# Altium footprint library My Footprint 3D.PCBLIB: 447 footprints (part 8 of 29)
Each footprint in its own frame and in the unit in brackets; x right, y up, seen from the top. Pads: shape width x height; smd on the part's side, far side on the other; paste and mask are expansions set on the pad; w line width, h text height; cw(c..) or ccw(c..) is an arc to the next point about the centre after c.
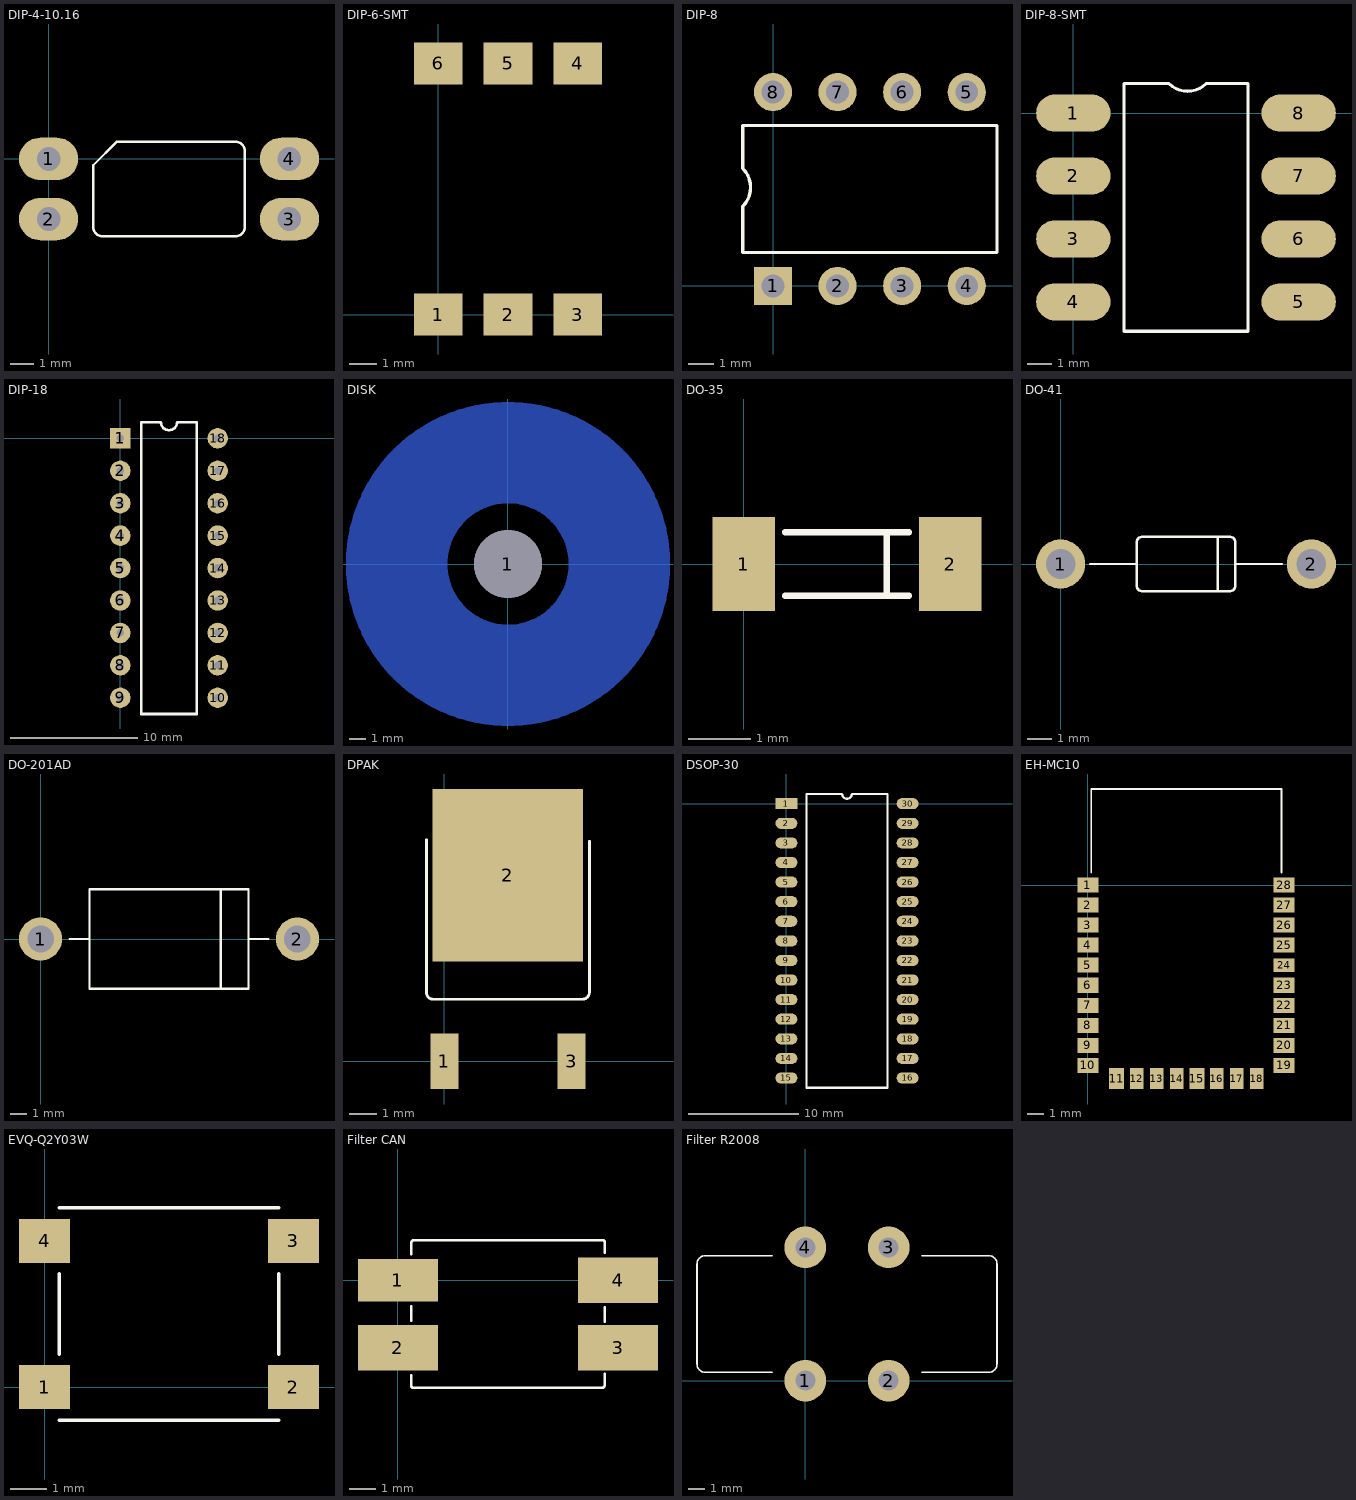
[diagram p7: the footprints below, top view; thin cyan lines are the x and y axes]

## DIP-4-10.16 [mm]
pads (4):
  oval 2.5x1.8 hole 1: 1(0,0) 2(0,-2.54) 3(10.16,-2.54) 4(10.16,0)
Top Overlay:
  lines w0.1: 1.88,-2.87 ccw(c2.28,-2.87) 2.28,-3.27 7.88,-3.27 ccw(c7.88,-2.87) 8.28,-2.87 8.28,0.33 ccw(c7.88,0.33) 7.88,0.73 2.88,0.73 1.88,-0.27 1.88,-2.87
3D body: height 4.01, standoff 4, extent 2.583,-0.369 3.38,0.429
3D body: height 2.4, standoff 2.1, extent 0.15,-3.14 2.05,-1.94
3D body: height 2.4, standoff 0.3, extent -0.15,-3.14 0.15,-1.94
3D body: height 1, standoff -2, extent -0.15,-2.79 0.15,-2.29
3D body: height 2.4, standoff 2.1, extent 0.15,-0.6 2.05,0.6
3D body: height 2.4, standoff 0.3, extent -0.15,-0.6 0.15,0.6
3D body: height 1, standoff -2, extent -0.15,-0.25 0.15,0.25
3D body: height 2.4, standoff 2.1, extent 8.11,-3.14 10.01,-1.94
3D body: height 2.4, standoff 0.3, extent 10.01,-3.14 10.31,-1.94
3D body: height 1, standoff -2, extent 10.01,-2.79 10.31,-2.29
3D body: height 1, standoff -2, extent 10.01,-0.25 10.31,0.25
3D body: height 2.4, standoff 0.3, extent 10.01,-0.6 10.31,0.6
3D body: height 2.4, standoff 2.1, extent 8.11,-0.6 10.01,0.6
3D body: height 4, standoff 0.5, extent 2.18,-3.774 8.584,1.23
3D body: height 3.5, standoff 0.5, extent 1.58,-3.77 8.58,1.23

## DIP-6-SMT [mm]
pads (6):
  rect 1.78x1.52 smd: 1(0,0) 2(2.54,0) 3(5.08,0) 4(5.08,9.144) 5(2.54,9.144) 6(0,9.144)
3D body: height 5, standoff 1.5, extent -1.71,1.422 6.79,7.722
3D body: height 3, standoff 2.8, extent -0.5,0.65 0.5,1.5
3D body: height 3, standoff 0.5, extent -0.5,0.45 0.5,0.65
3D body: height 0.5, standoff 0, extent -0.3,0.45 0.3,0.65
3D body: height 0.2, standoff 0, extent -0.3,-0.2 0.3,0.45
3D body: height 5.01, standoff 5, extent -0.595,2.001 0.6,3.199
3D body: height 3, standoff 2.8, extent 2.04,0.65 3.04,1.5
3D body: height 3, standoff 0.5, extent 2.04,0.45 3.04,0.65
3D body: height 0.5, standoff 0, extent 2.24,0.45 2.84,0.65
3D body: height 0.2, standoff 0, extent 2.24,-0.2 2.84,0.45
3D body: height 3, standoff 2.8, extent 4.58,0.65 5.58,1.5
3D body: height 3, standoff 0.5, extent 4.58,0.45 5.58,0.65
3D body: height 0.5, standoff 0, extent 4.78,0.45 5.38,0.65
3D body: height 0.2, standoff 0, extent 4.78,-0.2 5.38,0.45
3D body: height 3, standoff 2.8, extent 2.04,7.644 3.04,8.494
3D body: height 3, standoff 0.5, extent 2.04,8.494 3.04,8.694
3D body: height 0.5, standoff 0, extent 2.24,8.494 2.84,8.694
3D body: height 0.2, standoff 0, extent 2.24,8.694 2.84,9.344
3D body: height 3, standoff 2.8, extent -0.5,7.644 0.5,8.494
3D body: height 3, standoff 0.5, extent -0.5,8.494 0.5,8.694
3D body: height 0.5, standoff 0, extent -0.3,8.494 0.3,8.694
3D body: height 0.2, standoff 0, extent -0.3,8.694 0.3,9.344
3D body: height 3, standoff 2.8, extent 4.58,7.644 5.58,8.494
3D body: height 3, standoff 0.5, extent 4.58,8.494 5.58,8.694
3D body: height 0.5, standoff 0, extent 4.78,8.494 5.38,8.694
3D body: height 0.2, standoff 0, extent 4.78,8.694 5.38,9.344

## DIP-8 [mm]
pads (8):
  rect 1.5x1.5 hole 0.9: 1(0,0)
  round 1.5 hole 0.9: 2(2.54,0) 3(5.08,0) 4(7.62,0) 5(7.62,7.62) 6(5.08,7.62) 7(2.54,7.62) 8(0,7.62)
Top Overlay:
  lines w0.127: -1.19,1.31 8.81,1.31 8.81,6.31 -1.19,6.31 -1.19,4.619 cw(c-1.936,3.873) -1.19,3.128 -1.19,1.31
3D body: height 2.2, standoff 2, extent 7.12,6.86 8.12,7.71
3D body: height 2.2, standoff 0.2, extent 7.12,7.71 8.12,7.91
3D body: height 0.5, standoff -2, extent 7.32,7.71 7.92,7.91
3D body: height 2.2, standoff 2, extent 4.58,6.86 5.58,7.71
3D body: height 2.2, standoff 0.2, extent 4.58,7.71 5.58,7.91
3D body: height 0.5, standoff -2, extent 4.78,7.71 5.38,7.91
3D body: height 2.2, standoff 2, extent 2.04,6.86 3.04,7.71
3D body: height 2.2, standoff 0.2, extent 2.04,7.71 3.04,7.91
3D body: height 0.5, standoff -2, extent 2.24,7.71 2.84,7.91
3D body: height 2.2, standoff 2, extent -0.5,6.86 0.5,7.71
3D body: height 2.2, standoff 0.2, extent -0.5,7.71 0.5,7.91
3D body: height 0.5, standoff -2, extent -0.3,7.71 0.3,7.91
3D body: height 2.2, standoff 2, extent 7.12,-0.09 8.12,0.76
3D body: height 2.2, standoff 0.2, extent 7.12,-0.29 8.12,-0.09
3D body: height 0.5, standoff -2, extent 7.32,-0.29 7.92,-0.09
3D body: height 2.2, standoff 2, extent 4.58,-0.09 5.58,0.76
3D body: height 2.2, standoff 0.2, extent 4.58,-0.29 5.58,-0.09
3D body: height 0.5, standoff -2, extent 4.78,-0.29 5.38,-0.09
3D body: height 2.2, standoff 2, extent 2.04,-0.09 3.04,0.76
3D body: height 2.2, standoff 0.2, extent 2.04,-0.29 3.04,-0.09
3D body: height 0.5, standoff -2, extent 2.24,-0.29 2.84,-0.09
3D body: height 3.81, standoff 3.8, extent -0.595,1.261 0.6,2.459
3D body: height 0.5, standoff -2, extent -0.3,-0.29 0.3,-0.09
3D body: height 2.2, standoff 0.2, extent -0.5,-0.29 0.5,-0.09
3D body: height 2.2, standoff 2, extent -0.5,-0.09 0.5,0.76
3D body: height 3.8, standoff 0.5, extent -1.71,0.679 9.333,6.985

## DIP-8-SMT [mm]
height 8
pads (8):
  oval 3x1.5 smd: 1(0,0) 2(0,-2.54) 3(0,-5.08) 4(0,-7.62) 5(9.1,-7.62) 6(9.1,-5.08) 7(9.1,-2.54) 8(9.1,0)
Top Overlay:
  lines w0.127: 2.05,-8.81 7.05,-8.81 7.05,1.19 5.359,1.19 cw(c4.613,1.936) 3.868,1.19 2.05,1.19 2.05,-8.81
3D body: height 4, standoff 0.5, extent 1.419,-9.333 7.725,1.71
3D body: height 2.2, standoff 2, extent 0.65,-0.5 1.5,0.5
3D body: height 2.2, standoff 0.5, extent 0.45,-0.5 0.65,0.5
3D body: height 0.5, standoff 0, extent 0.45,-0.3 0.65,0.3
3D body: height 0.2, standoff 0, extent -0.2,-0.3 0.45,0.3
3D body: height 4.01, standoff 4, extent 2.001,-0.6 3.199,0.595
3D body: height 0.2, standoff 0, extent -0.2,-2.84 0.45,-2.24
3D body: height 0.5, standoff 0, extent 0.45,-2.84 0.65,-2.24
3D body: height 2.2, standoff 0.5, extent 0.45,-3.04 0.65,-2.04
3D body: height 2.2, standoff 2, extent 0.65,-3.04 1.5,-2.04
3D body: height 0.2, standoff 0, extent -0.2,-5.38 0.45,-4.78
3D body: height 0.5, standoff 0, extent 0.45,-5.38 0.65,-4.78
3D body: height 2.2, standoff 0.5, extent 0.45,-5.58 0.65,-4.58
3D body: height 2.2, standoff 2, extent 0.65,-5.58 1.5,-4.58
3D body: height 0.2, standoff 0, extent -0.2,-7.92 0.45,-7.32
3D body: height 0.5, standoff 0, extent 0.45,-7.92 0.65,-7.32
3D body: height 2.2, standoff 0.5, extent 0.45,-8.12 0.65,-7.12
3D body: height 2.2, standoff 2, extent 0.65,-8.12 1.5,-7.12
3D body: height 0.2, standoff 0, extent 8.65,-7.92 9.3,-7.32
3D body: height 0.5, standoff 0, extent 8.45,-7.92 8.65,-7.32
3D body: height 2.2, standoff 0.5, extent 8.45,-8.12 8.65,-7.12
3D body: height 2.2, standoff 2, extent 7.6,-8.12 8.45,-7.12
3D body: height 0.2, standoff 0, extent 8.65,-5.38 9.3,-4.78
3D body: height 0.5, standoff 0, extent 8.45,-5.38 8.65,-4.78
3D body: height 2.2, standoff 0.5, extent 8.45,-5.58 8.65,-4.58
3D body: height 2.2, standoff 2, extent 7.6,-5.58 8.45,-4.58
3D body: height 0.2, standoff 0, extent 8.65,-2.84 9.3,-2.24
3D body: height 0.5, standoff 0, extent 8.45,-2.84 8.65,-2.24
3D body: height 2.2, standoff 0.5, extent 8.45,-3.04 8.65,-2.04
3D body: height 2.2, standoff 2, extent 7.6,-3.04 8.45,-2.04
3D body: height 0.2, standoff 0, extent 8.65,-0.3 9.3,0.3
3D body: height 0.5, standoff 0, extent 8.45,-0.3 8.65,0.3
3D body: height 2.2, standoff 0.5, extent 8.45,-0.5 8.65,0.5
3D body: height 2.2, standoff 2, extent 7.6,-0.5 8.45,0.5

## DIP-18 [mm]
pads (18):
  rect 1.6x1.6 hole 0.6: 1(0,0)
  round 1.6 hole 0.6: 2(0,-2.54) 3(0,-5.08) 4(0,-7.62) 5(0,-10.16) 6(0,-12.7) 7(0,-15.24) 8(0,-17.78) 9(0,-20.32) 10(7.62,-20.32) 11(7.62,-17.78) 12(7.62,-15.24) 13(7.62,-12.7) 14(7.62,-10.16) 15(7.62,-7.62) 16(7.62,-5.08) 17(7.62,-2.54) 18(7.62,0)
Top Overlay:
  lines w0.2: 1.635,-21.59 5.985,-21.59 5.985,1.27 4.445,1.27 cw(c3.81,1.27) 3.175,1.27 1.635,1.27 1.635,-21.59

## DISK [mm]
pads (1):
  round 4.2 hole 4.2 unplated: 1(0,0)
Bottom Layer:
  circle w1.5: c0,0 r9.257
  circle w0.127: c0,0 r3.8
  circle w5: c0,0 r7
  circle w2: c0,0 r4.783
Bottom Solder:
  circle w1.5: c0,0 r9.257
  circle w5: c0,0 r7
  circle w0.127: c0,0 r3.8
  circle w3: c0,0 r3.556

## DO-35 [mm]
height 1
pads (2):
  rect 1x1.5 smd: 1(0,0) 2(3.302,0)
Top Overlay:
  lines w0.1: 0.66,-0.508 2.642,-0.508 ; 0.66,0.508 2.642,0.508 ; 2.286,-0.508 2.286,0.508
3D body: height 1.49, standoff 0, extent -0.099,-0.762 0.201,0.735
3D body: height 1.49, standoff 0, extent 3.101,-0.762 3.401,0.735
3D body: height 1.49, standoff 0, extent 0.201,-0.762 3.101,0.735
3D body: height 1.25, standoff 0.25, extent 0.201,-0.513 3.101,0.485
3D body: height 1.5, standoff -0.01, extent 2.522,-0.772 2.822,0.745

## DO-41 [mm]
pads (2):
  round 2 hole 1.2: 1(0,0) 2(10.2,0)
Top Overlay:
  lines w0.1: 1.2,0 3.1,0 ; 6.4,-1.1 6.4,1.1 ; 7.1,0 9,0 ; 3.1,-0.9 ccw(c3.3,-0.9) 3.3,-1.1 6.7,-1.1 6.9,-1.1 ccw(c6.9,-0.9) 7.1,-0.9 7.1,0.9 ccw(c6.9,0.9) 6.9,1.1 3.3,1.1 ccw(c3.3,0.9) 3.1,0.9 3.1,-0.9
3D body: height 1.9, standoff 1.1, extent 6.597,-0.399 10.597,0.399
3D body: height 1.5, standoff -2, extent 9.8,-0.399 10.597,0.399
3D body: height 1.5, standoff -2, extent -0.397,-0.399 0.4,0.399
3D body: height 1.9, standoff 1.1, extent -0.397,-0.399 3.603,0.399
3D body: height 2.9, standoff 0.09, extent 6.5,-1.407 7.1,1.407
3D body: height 2.89, standoff 0.1, extent 2.8,-1.394 7.4,1.4

## DO-201AD [mm]
pads (2):
  round 2.6 hole 1.6: 1(0,0) 2(15.5,0)
Top Overlay:
  lines w0.127: 1.75,0 2.95,0 ; 10.874,-3 10.874,3 ; 12.55,0.025 12.575,0 13.75,0 ; 2.95,-3 12.55,-3 12.55,3 2.95,3 2.95,-3

## DPAK [mm]
height 2.2
pads (3):
  rect 1x2 smd: 1(0,0) 3(4.57,0)
  rect 5.4x6.2 smd: 2(2.275,6.675)
Top Overlay:
  lines w0.1: -0.64,7.95 -0.64,2.45 ccw(c-0.415,2.45) -0.415,2.225 4.96,2.225 ccw(c4.96,2.475) 5.21,2.475 5.21,7.9
3D body: height 0.5, standoff 0, extent -0.4,-0.875 0.4,0.275
3D body: height 1.5, standoff 0, extent -0.4,0.275 0.4,0.775
3D body: height 1.5, standoff 1, extent -0.4,0.775 0.4,2.125
3D body: height 2.5, standoff 0, extent -1.015,2.137 5.585,8.137
3D body: height 1, standoff 0, extent -0.415,8.137 4.985,9.337
3D body: height 1.5, standoff 1, extent 1.885,1.137 2.685,2.137
3D body: height 1.5, standoff 1, extent 4.17,0.775 4.97,2.125
3D body: height 1.5, standoff 0, extent 4.17,0.275 4.97,0.775
3D body: height 0.5, standoff 0, extent 4.17,-0.875 4.97,0.275

## DSOP-30 [mm]
pads (30):
  rect 2x1 smd: 1(0,0)
  oval 2x1 smd: 2(0,-1.778) 3(0,-3.556) 4(0,-5.334) 5(0,-7.112) 6(0,-8.89) 7(0,-10.668) 8(0,-12.446) 9(0,-14.224) 10(0,-16.002) 11(0,-17.78) 12(0,-19.558) 13(0,-21.336) 14(0,-23.114) 15(0,-24.892) 16(11,-24.892) 17(11,-23.114) 18(11,-21.336) 19(11,-19.558) 20(11,-17.78) 21(11,-16.002) 22(11,-14.224) 23(11,-12.446) 24(11,-10.668) 25(11,-8.89) 26(11,-7.112) 27(11,-5.334) 28(11,-3.556) 29(11,-1.778) 30(11,0)
Top Overlay:
  lines w0.2: 1.835,-25.781 9.165,-25.781 9.165,0.889 5.944,0.889 cw(c5.5,0.889) 5.055,0.889 1.835,0.889 1.835,-25.781

## EH-MC10 [mm]
pads (28):
  rect 1.25x0.9 smd mask+0.05: 1(0,0) 2(0,-1.2) 3(0,-2.4) 4(0,-3.6) 5(0,-4.8) 6(0,-6) 7(0,-7.2) 8(0,-8.4) 9(0,-9.6) 10(0,-10.8) 19(11.756,-10.8) 20(11.756,-9.6) 21(11.756,-8.4) 22(11.756,-7.2) 23(11.756,-6) 25(11.756,-3.6) 26(11.756,-2.4) 27(11.756,-1.2) 28(11.756,0)
  rect 0.9x1.25 smd mask+0.05: 11(1.724,-11.586) 15(6.524,-11.586)
  rect 0.8x1.25 smd mask+0.05: 12(2.924,-11.586) 13(4.124,-11.586) 14(5.324,-11.586) 16(7.724,-11.586) 17(8.924,-11.586) 18(10.124,-11.586)
  rect 1.25x0.8 smd mask+0.05: 24(11.756,-4.8)
Top Overlay:
  lines w0.1: 0.2,0.75 0.2,5.75 11.6,5.75 11.6,0.75
3D body: height 0.81, standoff -0.1, extent -0.075,-0.275 0.2,0.275
3D body: height 0.81, standoff 0.8, extent -0.075,-0.425 0.35,0.425
3D body: height 0.81, standoff 0.8, extent -0.075,-1.625 0.35,-0.775
3D body: height 0.81, standoff -0.1, extent -0.075,-1.475 0.2,-0.925
3D body: height 0.81, standoff 0.8, extent -0.075,-2.825 0.35,-1.975
3D body: height 0.81, standoff -0.1, extent -0.075,-2.675 0.2,-2.125
3D body: height 0.81, standoff 0.8, extent -0.075,-4.025 0.35,-3.175
3D body: height 0.81, standoff -0.1, extent -0.075,-3.875 0.2,-3.325
3D body: height 0.81, standoff 0.8, extent -0.075,-5.225 0.35,-4.375
3D body: height 0.81, standoff -0.1, extent -0.075,-5.075 0.2,-4.525
3D body: height 0.81, standoff 0.8, extent -0.075,-6.425 0.35,-5.575
3D body: height 0.81, standoff -0.1, extent -0.075,-6.275 0.2,-5.725
3D body: height 0.81, standoff 0.8, extent -0.075,-7.625 0.35,-6.775
3D body: height 0.81, standoff -0.1, extent -0.075,-7.475 0.2,-6.925
3D body: height 0.81, standoff 0.8, extent -0.075,-8.825 0.35,-7.975
3D body: height 0.81, standoff -0.1, extent -0.075,-8.675 0.2,-8.125
3D body: height 0.81, standoff 0.8, extent -0.075,-10.025 0.35,-9.175
3D body: height 0.81, standoff -0.1, extent -0.075,-9.875 0.2,-9.325
3D body: height 0.81, standoff 0.8, extent -0.075,-11.225 0.35,-10.375
3D body: height 0.81, standoff -0.1, extent -0.075,-11.075 0.2,-10.525
3D body: height 0.81, standoff 0.8, extent 1.3,-11.7 2.15,-11.275
3D body: height 0.81, standoff -0.1, extent 1.45,-11.7 2,-11.425
3D body: height 0.81, standoff 0.8, extent 2.5,-11.7 3.35,-11.275
3D body: height 0.81, standoff -0.1, extent 2.65,-11.7 3.2,-11.425
3D body: height 0.81, standoff 0.8, extent 3.7,-11.7 4.55,-11.275
3D body: height 0.81, standoff -0.1, extent 3.85,-11.7 4.4,-11.425
3D body: height 0.81, standoff 0.8, extent 4.9,-11.7 5.75,-11.275
3D body: height 0.81, standoff -0.1, extent 5.05,-11.7 5.6,-11.425
3D body: height 0.81, standoff 0.8, extent 6.1,-11.7 6.95,-11.275
3D body: height 0.81, standoff -0.1, extent 6.25,-11.7 6.8,-11.425
3D body: height 0.81, standoff 0.8, extent 7.3,-11.7 8.15,-11.275
3D body: height 0.81, standoff -0.1, extent 7.45,-11.7 8,-11.425
3D body: height 0.81, standoff 0.8, extent 8.5,-11.7 9.35,-11.275
3D body: height 0.81, standoff -0.1, extent 8.65,-11.7 9.2,-11.425
3D body: height 0.81, standoff -0.1, extent 11.6,-11.075 11.875,-10.525
3D body: height 0.81, standoff -0.1, extent 11.6,-9.875 11.875,-9.325
3D body: height 0.81, standoff 0.8, extent 11.45,-10.025 11.875,-9.175
3D body: height 0.81, standoff -0.1, extent 11.6,-8.675 11.875,-8.125
3D body: height 0.81, standoff 0.8, extent 11.45,-8.825 11.875,-7.975
3D body: height 0.81, standoff -0.1, extent 11.6,-7.475 11.875,-6.925
3D body: height 0.81, standoff 0.8, extent 11.45,-7.625 11.875,-6.775
3D body: height 0.81, standoff -0.1, extent 11.6,-6.275 11.875,-5.725
3D body: height 0.81, standoff 0.8, extent 11.45,-6.425 11.875,-5.575
3D body: height 0.81, standoff -0.1, extent 11.6,-5.075 11.875,-4.525
3D body: height 0.81, standoff 0.8, extent 11.45,-5.225 11.875,-4.375
3D body: height 0.81, standoff -0.1, extent 11.6,-3.875 11.875,-3.325
3D body: height 0.81, standoff 0.8, extent 11.45,-4.025 11.875,-3.175
3D body: height 0.81, standoff -0.1, extent 11.6,-2.675 11.875,-2.125
3D body: height 0.81, standoff 0.8, extent 11.45,-2.825 11.875,-1.975
3D body: height 0.81, standoff -0.1, extent 11.6,-1.475 11.875,-0.925
3D body: height 0.81, standoff 0.8, extent 11.45,-1.625 11.875,-0.775
3D body: height 0.81, standoff 0.8, extent 11.45,-0.425 11.875,0.425
3D body: height 0.81, standoff -0.1, extent 11.6,-0.275 11.875,0.275
3D body: height 2.2, standoff 0.8, extent 0.6,-10.85 11.2,1.15
3D body: height 1.8, standoff 0.8, extent 8.2,3.45 10.4,5.45
3D body: height 1.81, standoff 0.8, extent 7.8,3.45 8.2,5.45
3D body: height 1.81, standoff 0.8, extent 10.4,3.45 10.8,5.45
3D body: height 0.8, standoff 0, extent -0.075,-11.7 11.875,6
3D body: height 0.81, standoff 0.8, extent 9.7,-11.7 10.55,-11.275
3D body: height 0.81, standoff -0.1, extent 9.85,-11.7 10.4,-11.425
3D body: height 0.81, standoff 0.8, extent 11.45,-11.225 11.875,-10.375

## EVQ-Q2Y03W [mm] "0"
height 0.9
pads (4):
  rect 1.4x1.2 smd: 1(0,0) 2(6.8,0) 3(6.8,4) 4(0,4)
Top Overlay:
  lines w0.1: 0.4,-0.9 6.4,-0.9 ; 0.4,0.9 0.4,3.1 ; 0.4,4.9 6.4,4.9 ; 6.4,0.9 6.4,3.1
3D body: height 2, standoff 1.9, extent 3.4,-1.1 6.7,2
3D body: height 2, standoff 1, extent 3.4,-1.1 5.1,-1
3D body: height 2, standoff 1.4, extent 6.6,0.5 6.7,2
3D body: height 1, standoff 0, extent 6.45,-0.4 6.75,0.4
3D body: height 2, standoff 1.9, extent 0.1,-1.1 3.4,2
3D body: height 2, standoff 1, extent 1.7,-1.1 3.4,-1
3D body: height 2, standoff 1.4, extent 0.1,0.5 0.2,2
3D body: height 1, standoff 0, extent 0.05,-0.4 0.35,0.4
3D body: height 2, standoff 1.9, extent 3.4,2 6.7,5.1
3D body: height 2, standoff 1, extent 3.4,5 5.1,5.1
3D body: height 2, standoff 1.4, extent 6.6,2 6.7,3.5
3D body: height 1, standoff 0, extent 6.45,3.6 6.75,4.4
3D body: height 1, standoff 0, extent 0.05,3.6 0.35,4.4
3D body: height 2, standoff 1.4, extent 0.1,2 0.2,3.5
3D body: height 2, standoff 1, extent 1.7,5 3.4,5.1
3D body: height 2, standoff 1.9, extent 0.1,2 3.4,5.1
3D body: height 3.4, standoff 1.9, extent 1.912,0.503 4.9,3.497
3D body: height 1.91, standoff 1.9, extent 1.019,-0.395 5.8,4.395
3D body: height 1.9, standoff 0, extent 0.2,-1 6.6,5

## FAN [mm]
3D body: height 10, standoff 0, extent 0,-10 8,10

## Filter CAN [mm]
pads (4):
  rect 3x1.6 smd: 1(0,0)
  rect 3x1.7 smd: 2(0,-2.54) 3(8.25,-2.54) 4(8.25,0)
Top Overlay:
  lines w0.1: 0.5,-3.565 0.5,-3.965 ccw(c0.575,-3.965) 0.575,-4.04 7.65,-4.04 ccw(c7.65,-3.94) 7.75,-3.94 7.75,-3.515 ; 0.5,-1.525 0.5,-0.975 ; 0.5,0.975 0.5,1.4 cw(c0.6,1.4) 0.6,1.5 7.675,1.5 cw(c7.675,1.425) 7.75,1.425 7.75,1.025 ; 7.75,-1.565 7.75,-1.015
3D body: height 4.5, standoff 4.3, extent 7.999,-4.293 8.124,1.753
3D body: height 4.5, standoff 4.3, extent 0.126,-4.293 0.251,1.753
3D body: height 4.5, standoff 4.3, extent 0.125,-4.293 8.125,-4.168
3D body: height 4.5, standoff 4.3, extent 0.124,1.628 8.124,1.753
3D body: height 1.1, standoff 0.9, extent -0.307,-0.787 0.125,0.787
3D body: height 1.1, standoff 0, extent -0.574,-0.787 -0.307,0.787
3D body: height 0.2, standoff 0, extent -1.26,-0.787 -0.574,0.787
3D body: height 1.1, standoff 0.9, extent -0.307,-3.327 0.125,-1.753
3D body: height 1.1, standoff 0, extent -0.574,-3.327 -0.307,-1.753
3D body: height 0.2, standoff 0, extent -1.26,-3.327 -0.574,-1.753
3D body: height 1.1, standoff 0.9, extent 8.125,-3.327 8.557,-1.753
3D body: height 1.1, standoff 0, extent 8.557,-3.327 8.824,-1.753
3D body: height 0.2, standoff 0, extent 8.824,-3.327 9.51,-1.753
3D body: height 0.2, standoff 0, extent 8.824,-0.787 9.51,0.787
3D body: height 1.1, standoff 0, extent 8.557,-0.787 8.824,0.787
3D body: height 1.1, standoff 0.9, extent 8.125,-0.787 8.557,0.787
3D body: height 4.3, standoff 0.2, extent 0.124,-4.293 8.125,1.753

## Filter R2008 [mm]
pads (4):
  round 2.5 hole 1.2: 1(0,0) 2(5,0) 3(5,8) 4(0,8)
Top Overlay:
  lines w0.1: -2,0.5 -6,0.5 cw(c-6,1) -6.5,1 -6.5,7 cw(c-6,7) -6,7.5 -2,7.5 ; 7,0.5 11,0.5 ccw(c11,1) 11.5,1 11.5,7 ccw(c11,7) 11,7.5 7,7.5
3D body: height 19.92, standoff 0, extent -7.461,0 12.5,8
3D body: height 6.1, standoff 1.66, extent -0.998,-0.8 0.998,2.44
3D body: height 3, standoff -2, extent -0.399,-0.397 0.399,0.4
3D body: height 3, standoff -2, extent 4.601,-0.397 5.399,0.4
3D body: height 6.1, standoff 1.66, extent 4.002,-0.8 5.998,2.44
3D body: height 3, standoff -2, extent 4.601,7.6 5.399,8.397
3D body: height 6.1, standoff 1.66, extent 4.002,5.56 5.998,8.8
3D body: height 3, standoff -2, extent -0.399,7.6 0.399,8.397
3D body: height 6.1, standoff 1.66, extent -0.998,5.56 0.998,8.8